# Altium footprint library Pasivos.PcbLib: 138 footprints (part 7 of 9)
Each footprint in its own frame and in the unit in brackets; x right, y up, seen from the top. Pads: shape width x height; smd on the part's side, far side on the other; paste and mask are expansions set on the pad; w line width, h text height; cw(c..) or ccw(c..) is an arc to the next point about the centre after c.
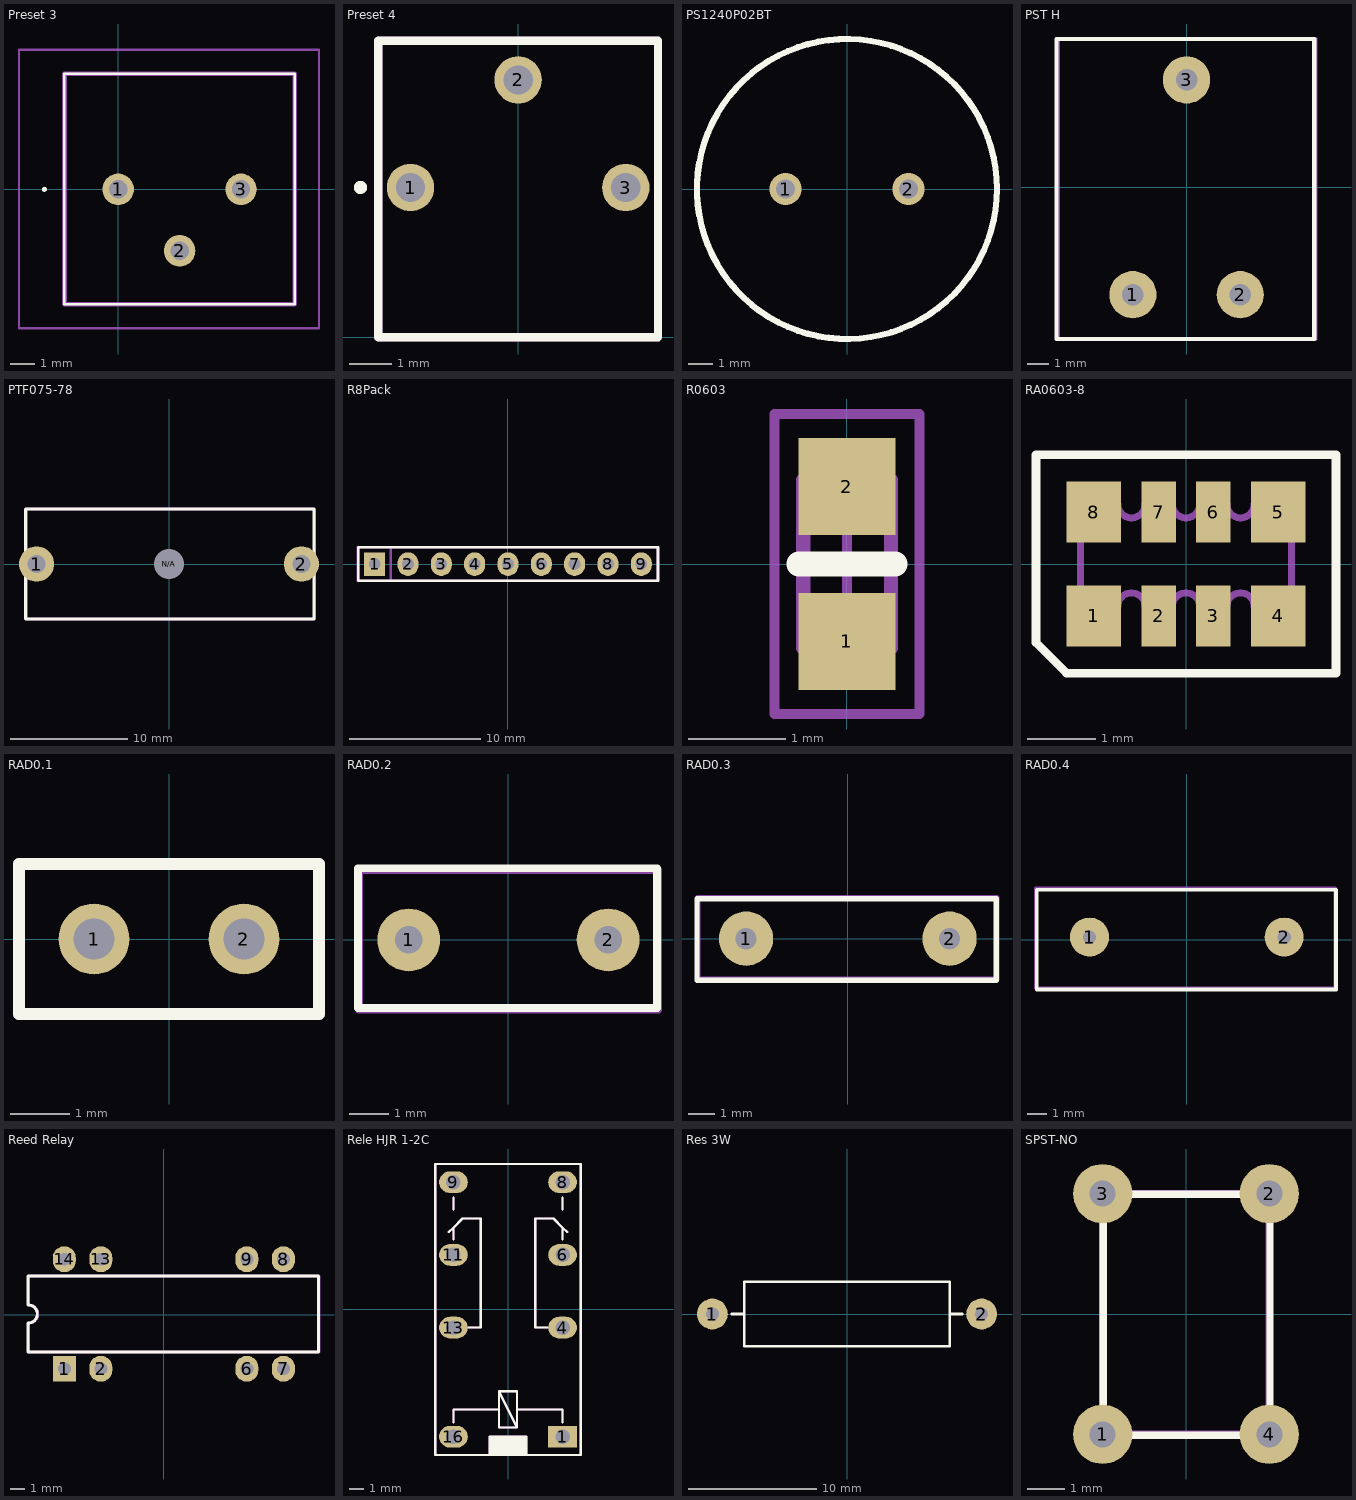
[diagram p6: the footprints below, top view; thin cyan lines are the x and y axes]

## Preset 3 [mm] "3386P-EY5-202LF"
pads (3):
  round 1.303 hole 0.76: 1(0,0) 2(2.54,-2.54) 3(5.08,0)
Top Overlay:
  lines w0.1: -3.1,0 cw(c-3.05,0) -3,0 cw(c-3.05,0) -3.1,0 ; -2.225,-4.75 7.305,-4.75 7.305,4.78 -2.225,4.78 -2.225,-4.75
Mechanical 13:
  lines w0.2: -2.225,-4.75 7.305,-4.75 7.305,4.78 -2.225,4.78 -2.225,-4.75
Mechanical 15:
  lines w0.1: -4.1,-5.75 8.305,-5.75 8.305,5.78 -4.1,5.78 -4.1,-5.75

## Preset 4 [mm] "3362P-1-103LF"
pads (3):
  round 1.12 hole 0.69: 1(-2.54,3.53) 2(0,6.07) 3(2.54,3.53)
Top Overlay:
  circle w0.2: c-3.722,3.532 r0.057
  lines w0.2: -3.3,0 -3.3,6.99 3.3,6.99 3.3,0 -3.3,0
Mechanical 13:
  lines w0.2: -3.3,0 3.3,0 3.3,6.99 -3.3,6.99 -3.3,0
3D body "3362P-1-102LF.step": height 4.74, standoff -2.65, extent -3.342,0.225 3.258,6.825

## PS1240P02BT [mm] "Piezo Buzzers & Audio Indicators Round 12.2mmx6.5mm 4kHz Vin=3V"
pads (2):
  round 1.3 hole 0.762: 1(-2.5,0) 2(2.5,0)
Top Overlay:
  circle w0.254: c0,0 r6.1

## PST H [mm] "Preset Horizontal"
pads (3):
  round 2.2 hole 1: 1(-2.5,-5) 2(2.5,-5) 3(0,5)
Top Overlay:
  lines w0.2: -6.053,-7.065 -6.053,6.905 5.947,6.905 5.947,-7.065 -6.053,-7.065
Mechanical 29:
  lines w0.2: -6,-7.065 6,-7.065 6,6.905 -6,6.905 -6,-7.065
  text "'.Designator'" at -0.367,-0.046 h0.5

## PTF075-78 [mm] "FUSE BLOCK CARTRIDGE PCB"
pads (3):
  round 3 hole 1.55: 1(-11.3,0) 2(11.3,0)
  round 1.524 hole 2.6: N/A(0,0)
Top Overlay:
  lines w0.254: -12.243,-4.7 12.367,-4.7 12.367,4.7 -12.243,4.7 -12.243,-4.7
Mechanical 29:
  lines w0.254: -12.18,-4.7 -12.18,4.7 12.43,4.7 12.43,-4.7 -12.18,-4.7
  text "'.Designator'" at -0.379,-0.016 h0.5
3D body "5x20mm PCB Fuse Holder Assy_ 1.STEP": height 13.97, standoff -4.38, extent -12.02,-4.57 12.23,4.43

## R8Pack [mm] "Pack de resistencias con punto en común"
pads (9):
  rect 1.6x1.8 hole 0.9: 1(-10.16,0)
  oval 1.6x1.8 hole 0.9: 2(-7.62,0) 3(-5.08,0) 4(-2.54,0) 5(0,0) 6(2.54,0) 7(5.08,0) 8(7.62,0) 9(10.16,0)
Top Overlay:
  lines w0.2: -11.424,-1.261 11.436,-1.261 11.436,1.279 -11.424,1.279 -11.424,-1.261
Mechanical 29:
  lines w0.2: -8.922,-1.27 -8.922,1.27 ; -11.43,-1.27 -11.43,1.27 11.43,1.27 11.43,-1.27 -11.43,-1.27
  text "'.Designator'" at -8.592,-0.251 h0.5
3D body "R8Pack.step": height 6.3, standoff -2.2, extent -11.123,-0.615 11.377,0.635

## R0603 [mm] "1.60mm x 0.80mm"
pads (2):
  rect 1x1 smd: 1(0,-0.8) 2(0,0.8)
Top Overlay:
  lines w0.254: -0.5,0 0.5,0
Mechanical 13:
  lines w0.1: -0.475,-0.875 0.475,-0.875 0.475,0.875 -0.475,0.875 -0.475,-0.875
Mechanical 15:
  lines w0.1: -0.475,0 0.475,0 ; 0,-0.475 0,0.475 ; -0.75,-1.55 0.75,-1.55 0.75,1.55 -0.75,1.55 -0.75,-1.55
Mechanical 29:
  lines w0.1: -0.427,-1.11 -0.427,1.04 0.433,1.04 0.433,-1.11 -0.427,-1.11
  text "'.Designator'" at 0.264,-0.94 h0.5
3D body "RES0603.STEP": height 0.45, standoff -0.01, extent -0.4,-0.8 0.4,0.8

## RA0603-8 [mm]
pads (8):
  rect 0.8x0.9 smd: 1(-1.35,-0.762) 4(1.35,-0.762) 5(1.35,0.762) 8(-1.35,0.762)
  rect 0.5x0.89 smd: 2(-0.4,-0.762) 7(-0.4,0.762)
  rect 0.5x0.9 smd: 3(0.4,-0.762) 6(0.4,0.762)
Top Overlay:
  lines w0.127: -2.2,-1.153 -1.753,-1.6 2.2,-1.6 2.2,1.6 -2.2,1.6 -2.2,-1.153
Mechanical 13:
  lines w0.102: -1.55,-0.623 -1.55,0.877 ; -1.55,-0.623 -1,-0.623 ; -1.55,-0.623 -1.55,0.877 ; -1.55,-0.623 -1,-0.623 ; -1.55,0.877 -1,0.877 ; -1.55,0.877 -1,0.877 ; -1,-0.623 cw(c-0.8,-0.623) -0.6,-0.623 ; -1,-0.623 cw(c-0.8,-0.623) -0.6,-0.623 ; -1,0.877 ccw(c-0.8,0.877) -0.6,0.877 ; -1,0.877 ccw(c-0.8,0.877) -0.6,0.877 ; -0.6,-0.623 -0.2,-0.623 ; -0.6,-0.623 -0.2,-0.623 ; -0.6,0.877 -0.2,0.877 ; -0.6,0.877 -0.2,0.877 ; -0.2,-0.623 cw(c0,-0.623) 0.2,-0.623 ; -0.2,-0.623 cw(c0,-0.623) 0.2,-0.623 ; -0.2,0.877 ccw(c0,0.877) 0.2,0.877 ; -0.2,0.877 ccw(c0,0.877) 0.2,0.877 ; 0.2,-0.623 0.6,-0.623 ; 0.2,-0.623 0.6,-0.623 ; 0.2,0.877 0.6,0.877 ; 0.2,0.877 0.6,0.877 ; 0.6,-0.623 cw(c0.8,-0.623) 1,-0.623 ; 0.6,-0.623 cw(c0.8,-0.623) 1,-0.623 ; 0.6,0.877 ccw(c0.8,0.877) 1,0.877 ; 0.6,0.877 ccw(c0.8,0.877) 1,0.877 ; 1,-0.623 1.55,-0.623 ; 1,-0.623 1.55,-0.623 ; 1,0.877 1.55,0.877 ; 1,0.877 1.55,0.877 ; 1.55,-0.623 1.55,0.877 ; 1.55,-0.623 1.55,0.877
3D body "68438.stp": height 0.44, standoff -0.06, extent -1.6,-0.838 1.6,0.762

## RAD0.1 [mm]
pads (2):
  round 1.2 hole 0.7: 1(-1.27,0) 2(1.27,0)
Top Overlay:
  lines w0.2: -2.54,-1.27 -2.54,1.27 2.54,1.27 2.54,-1.27 -2.54,-1.27
Mechanical 29:
  lines w0.2: -2.54,-1.27 2.54,-1.27 2.54,1.27 -2.54,1.27 -2.54,-1.27
  text "'.Designator'" at -2.231,-0.219 h0.5
3D body "RAD0.1.STEP": height 13.84, standoff -2.54, extent -2.988,-1.524 2.988,1.651

## RAD0.2 [mm]
pads (2):
  round 1.6 hole 0.7: 1(-2.54,0) 2(2.54,0)
Top Overlay:
  lines w0.2: -3.833,-1.732 3.787,-1.732 3.787,1.824 -3.833,1.824 -3.833,-1.732
Mechanical 29:
  lines w0.2: -3.81,-1.778 -3.81,1.778 3.81,1.778 3.81,-1.778 -3.81,-1.778
  text "'.Designator'" at -3.312,-0.28 h0.5
3D body "RAD0.2.STEP": height 10.5, standoff -2.12, extent -3.079,-1.9 2.921,1.9

## RAD0.3 [mm]
pads (2):
  round 2.035 hole 0.8: 1(-3.81,0) 2(3.81,0)
Top Overlay:
  lines w0.2: -5.647,-1.555 5.557,-1.555 5.557,1.493 -5.647,1.493 -5.647,-1.555
Mechanical 29:
  lines w0.2: -5.617,-1.524 -5.617,1.524 5.588,1.524 5.588,-1.524 -5.617,-1.524
  text "'.Designator'" at -5.159,-0.236 h0.5
3D body "RAD0.3.STEP": height 2, standoff -9, extent -5.617,-1 5.588,1

## RAD0.4 [mm]
pads (2):
  round 2.035 hole 0.7: 1(-5.08,0.127) 2(5.08,0.127)
Top Overlay:
  lines w0.2: -7.838,-2.612 7.783,-2.612 7.783,2.595 -7.838,2.595 -7.838,-2.612
Mechanical 29:
  lines w0.2: -7.874,-2.54 -7.874,2.667 7.747,2.667 7.747,-2.54 -7.874,-2.54
  text "'.Designator'" at -7.442,-0.147 h0.5
3D body "RAD0.4.STEP": height 14.5, standoff -2, extent -9.017,-2.873 8.983,3.127

## Reed Relay [mm]
pads (8):
  rect 1.6x1.8 hole 0.9: 1(-6.911,-3.759)
  oval 1.6x1.8 hole 0.9: 2(-4.371,-3.759) 6(5.789,-3.759) 7(8.329,-3.759) 8(8.329,3.861) 9(5.789,3.861) 13(-4.371,3.861) 14(-6.911,3.861)
Top Overlay:
  lines w0.2: -9.428,-2.599 -9.428,-0.584 ccw(c-9.428,0.051) -9.428,0.686 -9.428,2.701 10.772,2.701 10.772,-2.599 -9.428,-2.599
Mechanical 29:
  lines w0.2: -9.391,-2.599 10.809,-2.599 10.809,2.701 -9.391,2.701 -9.391,0.686 cw(c-9.391,0.051) -9.391,-0.584 -9.391,-2.599
  text "'.Designator'" at -8.227,-0.268 h0.5
3D body "Reed Relay.STEP": height 5.12, standoff -2.42, extent -8.888,-3.937 10.412,3.933

## Rele HJR 1-2C [mil] "Rele de 2 contactos"
pads (8):
  rect 78.74x60 hole 40: 1(150,-350)
  oval 78.74x60 hole 40: 4(150,-50) 6(150,150) 8(150,350) 9(-150,350) 11(-150,150) 13(-150,-50) 16(-150,-350)
Top Overlay:
  region: 50,-400 50,-350 -50,-350 -50,-400
  lines w6: -163,213 -150,225 ; -150,-310 -150,-275 -25,-275 ; -150,193 -150,225 ; -150,275 -150,308 ; -110,-50 -75,-50 -75,250 -125,250 -150,225 ; 110,-50 75,-50 75,250 125,250 150,225 ; 150,-310 150,-275 25,-275 ; 150,193 150,225 ; 150,275 150,308 ; 163,213 150,225 ; -50,-400 50,-400 ; -50,-400 -50,-350 50,-350 50,-400 ; -50,-400 -200,-400 -200,400 200,400 200,-400 50,-400 ; -25,-275 -25,-225 ; -25,-275 -25,-325 25,-325 ; -25,-225 25,-325 ; -25,-225 25,-225 25,-275 ; 25,-325 25,-275
Mechanical 29:
  region: 50,-400 50,-350 -50,-350 -50,-400
  lines w6: -163,213 -150,225 ; -150,-310 -150,-275 -25,-275 ; -150,193 -150,225 ; -150,275 -150,308 ; -110,-50 -75,-50 -75,250 -125,250 -150,225 ; 110,-50 75,-50 75,250 125,250 150,225 ; 150,-310 150,-275 25,-275 ; 150,193 150,225 ; 150,275 150,308 ; 163,213 150,225 ; -50,-400 -200,-400 -200,400 200,400 200,-400 50,-400 ; -50,-400 -50,-350 50,-350 50,-400 ; -50,-400 50,-400 ; -25,-275 -25,-325 25,-325 ; -25,-275 -25,-225 ; -25,-225 25,-225 25,-275 ; -25,-225 25,-325 ; 25,-325 25,-275
  text "'.Designator'" at 1.39,-15.41 h19.68
3D body "rly_dpdt_20x9_8x12mm.step": height 474.41, standoff -137.8, extent -197.91,-395 187.91,392.4

## Res 3W [mm]
height 5
pads (2):
  round 2.4 hole 1: 1(-10.5,0) 2(10.5,0)
Top Overlay:
  lines w0.2: -9,0 -8,0 ; 8,0 9,0 ; -8,-2.5 -8,2.5 8,2.5 8,-2.5 -8,-2.5
3D body "User Library-AXIAL_RESISTOR(3W).STEP": height 8.3, standoff -2, extent -11.1,-3 11.1,3.6

## SPST-NO [mm] "PushBtn"
pads (4):
  round 1.6 hole 0.7: 1(-2.25,-3.25) 2(2.25,3.25) 3(-2.25,3.25) 4(2.25,-3.25)
Top Overlay:
  lines w0.2: -2.231,-3.269 2.269,-3.269 2.269,3.231 -2.231,3.231 -2.231,-3.269
Mechanical 29:
  lines w0.2: -2.25,-3.25 -2.25,3.25 2.25,3.25 2.25,-3.25 -2.25,-3.25
  text "'.Designator'" at 0.174,-2.985 h0.5
3D body "SPST-NO Pushbutton.step": height 3, standoff -10, extent -2.992,-4.12 3.008,4.092